# Altium footprint library cool_library.PcbLib: 1182 footprints (part 32 of 75)
Each footprint in its own frame and in the unit in brackets; x right, y up, seen from the top. Pads: shape width x height; smd on the part's side, far side on the other; paste and mask are expansions set on the pad; w line width, h text height; cw(c..) or ccw(c..) is an arc to the next point about the centre after c.
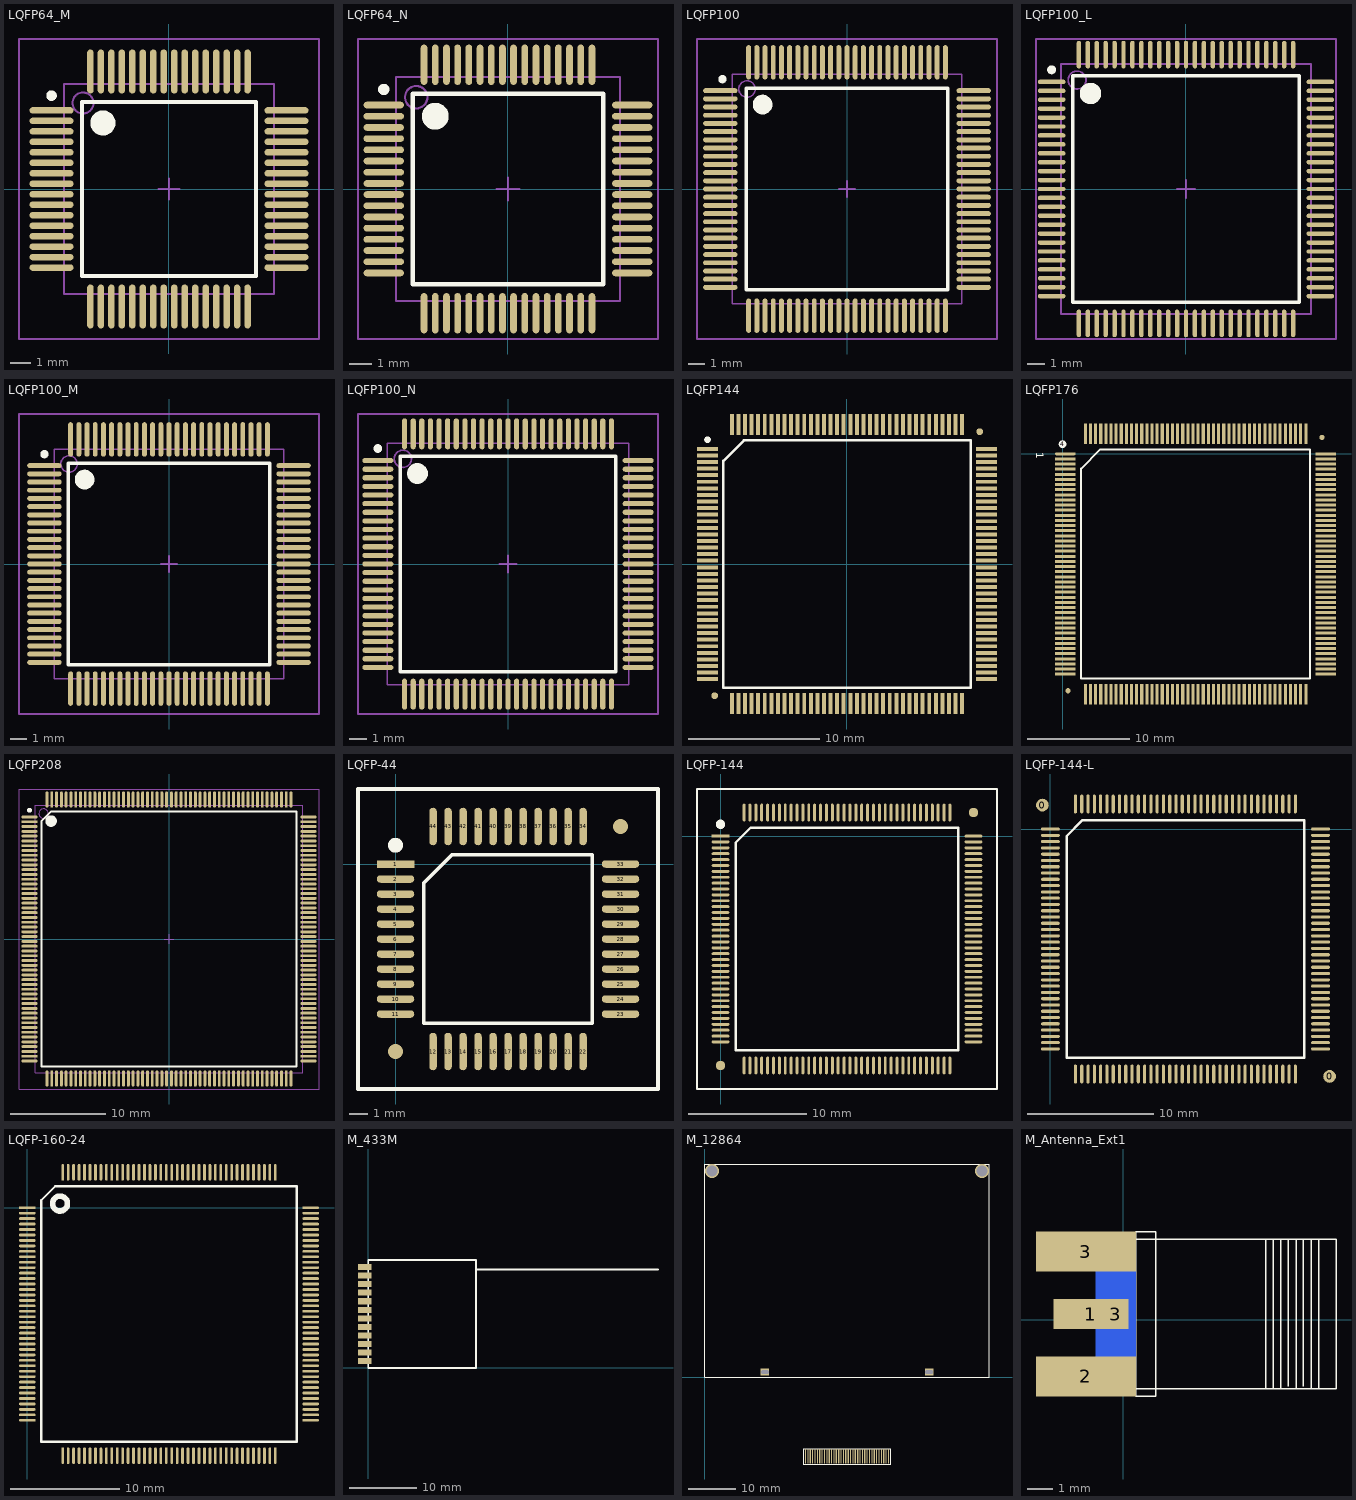
[diagram p31: the footprints below, top view; thin cyan lines are the x and y axes]

## LQFP64_M [mm] "Thin QFP, 64-Leads, Body 10x10mm, Pitch 0.5mm, IPC Low Density"
height 1.6
pads (64):
  oval 2.1x0.3 smd: 1(-5.6,3.75) 2(-5.6,3.25) 3(-5.6,2.75) 4(-5.6,2.25) 5(-5.6,1.75) 6(-5.6,1.25) 7(-5.6,0.75) 8(-5.6,0.25) 9(-5.6,-0.25) 10(-5.6,-0.75) 11(-5.6,-1.25) 12(-5.6,-1.75) 13(-5.6,-2.25) 14(-5.6,-2.75) 15(-5.6,-3.25) 16(-5.6,-3.75) 33(5.6,-3.75) 34(5.6,-3.25) 35(5.6,-2.75) 36(5.6,-2.25) 37(5.6,-1.75) 38(5.6,-1.25) 39(5.6,-0.75) 40(5.6,-0.25) 41(5.6,0.25) 42(5.6,0.75) 43(5.6,1.25) 44(5.6,1.75) 45(5.6,2.25) 46(5.6,2.75) 47(5.6,3.25) 48(5.6,3.75)
  oval 0.3x2.1 smd: 17(-3.75,-5.6) 18(-3.25,-5.6) 19(-2.75,-5.6) 20(-2.25,-5.6) 21(-1.75,-5.6) 22(-1.25,-5.6) 23(-0.75,-5.6) 24(-0.25,-5.6) 25(0.25,-5.6) 26(0.75,-5.6) 27(1.25,-5.6) 28(1.75,-5.6) 29(2.25,-5.6) 30(2.75,-5.6) 31(3.25,-5.6) 32(3.75,-5.6) 49(3.75,5.6) 50(3.25,5.6) 51(2.75,5.6) 52(2.25,5.6) 53(1.75,5.6) 54(1.25,5.6) 55(0.75,5.6) 56(0.25,5.6) 57(-0.25,5.6) 58(-0.75,5.6) 59(-1.25,5.6) 60(-1.75,5.6) 61(-2.25,5.6) 62(-2.75,5.6) 63(-3.25,5.6) 64(-3.75,5.6)
Top Overlay:
  circle w0.6: c-3.15,3.15 r0.3
  circle w0.25: c-5.6,4.45 r0.125
  lines w0.2: -4.15,-4.15 4.15,-4.15 4.15,4.15 -4.15,4.15 -4.15,-4.15
Mechanical 13:
  circle w0.1: c-4.1,4.1 r0.5
  lines w0.1: -5,-5 5,-5 5,5 -5,5 -5,-5
Mechanical 15:
  lines w0.1: -0.5,0 0.5,0 ; 0,-0.5 0,0.5 ; -7.15,-7.15 7.15,-7.15 7.15,7.15 -7.15,7.15 -7.15,-7.15
3D body: height 1.6, standoff 0, extent -5,-5 5,5

## LQFP64_N [mm] "Thin QFP, 64-Leads, Body 10x10mm, Pitch 0.5mm, IPC Medium Density"
height 1.6
pads (64):
  oval 1.8x0.3 smd: 1(-5.55,3.75) 2(-5.55,3.25) 3(-5.55,2.75) 4(-5.55,2.25) 5(-5.55,1.75) 6(-5.55,1.25) 7(-5.55,0.75) 8(-5.55,0.25) 9(-5.55,-0.25) 10(-5.55,-0.75) 11(-5.55,-1.25) 12(-5.55,-1.75) 13(-5.55,-2.25) 14(-5.55,-2.75) 15(-5.55,-3.25) 16(-5.55,-3.75) 33(5.55,-3.75) 34(5.55,-3.25) 35(5.55,-2.75) 36(5.55,-2.25) 37(5.55,-1.75) 38(5.55,-1.25) 39(5.55,-0.75) 40(5.55,-0.25) 41(5.55,0.25) 42(5.55,0.75) 43(5.55,1.25) 44(5.55,1.75) 45(5.55,2.25) 46(5.55,2.75) 47(5.55,3.25) 48(5.55,3.75)
  oval 0.3x1.8 smd: 17(-3.75,-5.55) 18(-3.25,-5.55) 19(-2.75,-5.55) 20(-2.25,-5.55) 21(-1.75,-5.55) 22(-1.25,-5.55) 23(-0.75,-5.55) 24(-0.25,-5.55) 25(0.25,-5.55) 26(0.75,-5.55) 27(1.25,-5.55) 28(1.75,-5.55) 29(2.25,-5.55) 30(2.75,-5.55) 31(3.25,-5.55) 32(3.75,-5.55) 49(3.75,5.55) 50(3.25,5.55) 51(2.75,5.55) 52(2.25,5.55) 53(1.75,5.55) 54(1.25,5.55) 55(0.75,5.55) 56(0.25,5.55) 57(-0.25,5.55) 58(-0.75,5.55) 59(-1.25,5.55) 60(-1.75,5.55) 61(-2.25,5.55) 62(-2.75,5.55) 63(-3.25,5.55) 64(-3.75,5.55)
Top Overlay:
  circle w0.6: c-3.25,3.25 r0.3
  circle w0.25: c-5.55,4.45 r0.125
  lines w0.2: -4.25,-4.25 4.25,-4.25 4.25,4.25 -4.25,4.25 -4.25,-4.25
Mechanical 13:
  circle w0.1: c-4.1,4.1 r0.5
  lines w0.1: -5,-5 5,-5 5,5 -5,5 -5,-5
Mechanical 15:
  lines w0.1: -0.5,0 0.5,0 ; 0,-0.5 0,0.5 ; -6.7,-6.7 6.7,-6.7 6.7,6.7 -6.7,6.7 -6.7,-6.7
3D body: height 1.6, standoff 0, extent -5,-5 5,5

## LQFP100 [mm]
pads (100):
  oval 2.1x0.3 smd: 1(-7.727,6) 2(-7.727,5.5) 3(-7.727,5) 4(-7.727,4.5) 5(-7.727,4) 6(-7.727,3.5) 7(-7.727,3) 8(-7.727,2.5) 9(-7.727,2) 10(-7.727,1.5) 11(-7.727,1) 12(-7.727,0.5) 13(-7.727,0) 14(-7.727,-0.5) 15(-7.727,-1) 16(-7.727,-1.5) 17(-7.727,-2) 18(-7.727,-2.5) 19(-7.727,-3) 20(-7.727,-3.5) 21(-7.727,-4) 22(-7.727,-4.5) 23(-7.727,-5) 24(-7.727,-5.5) 25(-7.727,-6) 51(7.727,-6) 52(7.727,-5.5) 53(7.727,-5) 54(7.727,-4.5) 55(7.727,-4) 56(7.727,-3.5) 57(7.727,-3) 58(7.727,-2.5) 59(7.727,-2) 60(7.727,-1.5) 61(7.727,-1) 62(7.727,-0.5) 63(7.727,0) 64(7.727,0.5) 65(7.727,1) 66(7.727,1.5) 67(7.727,2) 68(7.727,2.5) 69(7.727,3) 70(7.727,3.5) 71(7.727,4) 72(7.727,4.5) 73(7.727,5) 74(7.727,5.5) 75(7.727,6)
  oval 0.3x2.1 smd: 26(-6,-7.727) 27(-5.5,-7.727) 28(-5,-7.727) 29(-4.5,-7.727) 30(-4,-7.727) 31(-3.5,-7.727) 32(-3,-7.727) 33(-2.5,-7.727) 34(-2,-7.727) 35(-1.5,-7.727) 36(-1,-7.727) 37(-0.5,-7.727) 38(0,-7.727) 39(0.5,-7.727) 40(1,-7.727) 41(1.5,-7.727) 42(2,-7.727) 43(2.5,-7.727) 44(3,-7.727) 45(3.5,-7.727) 46(4,-7.727) 47(4.5,-7.727) 48(5,-7.727) 49(5.5,-7.727) 50(6,-7.727) 76(6,7.727) 77(5.5,7.727) 78(5,7.727) 79(4.5,7.727) 80(4,7.727) 81(3.5,7.727) 82(3,7.727) 83(2.5,7.727) 84(2,7.727) 85(1.5,7.727) 86(1,7.727) 87(0.5,7.727) 88(0,7.727) 89(-0.5,7.727) 90(-1,7.727) 91(-1.5,7.727) 92(-2,7.727) 93(-2.5,7.727) 94(-3,7.727) 95(-3.5,7.727) 96(-4,7.727) 97(-4.5,7.727) 98(-5,7.727) 99(-5.5,7.727) 100(-6,7.727)
Top Overlay:
  circle w0.6: c-5.15,5.15 r0.3
  circle w0.25: c-7.6,6.7 r0.125
  lines w0.2: -6.15,-6.15 6.15,-6.15 6.15,6.15 -6.15,6.15 -6.15,-6.15
Mechanical 13:
  circle w0.1: c-6.1,6.1 r0.5
  lines w0.1: -7,-7 7,-7 7,7 -7,7 -7,-7
Mechanical 15:
  lines w0.1: -0.5,0 0.5,0 ; 0,-0.5 0,0.5 ; -9.15,-9.15 9.15,-9.15 9.15,9.15 -9.15,9.15 -9.15,-9.15
3D body: height 1.6, standoff 0, extent -7.999,-8 8.001,8

## LQFP100_L [mm] "Thin QFP, 100-Leads, Body 14x14mm, Pitch 0.5mm, IPC High Density"
height 1.6
pads (100):
  oval 1.55x0.25 smd: 1(-7.525,6) 2(-7.525,5.5) 3(-7.525,5) 4(-7.525,4.5) 5(-7.525,4) 6(-7.525,3.5) 7(-7.525,3) 8(-7.525,2.5) 9(-7.525,2) 10(-7.525,1.5) 11(-7.525,1) 12(-7.525,0.5) 13(-7.525,0) 14(-7.525,-0.5) 15(-7.525,-1) 16(-7.525,-1.5) 17(-7.525,-2) 18(-7.525,-2.5) 19(-7.525,-3) 20(-7.525,-3.5) 21(-7.525,-4) 22(-7.525,-4.5) 23(-7.525,-5) 24(-7.525,-5.5) 25(-7.525,-6) 51(7.525,-6) 52(7.525,-5.5) 53(7.525,-5) 54(7.525,-4.5) 55(7.525,-4) 56(7.525,-3.5) 57(7.525,-3) 58(7.525,-2.5) 59(7.525,-2) 60(7.525,-1.5) 61(7.525,-1) 62(7.525,-0.5) 63(7.525,0) 64(7.525,0.5) 65(7.525,1) 66(7.525,1.5) 67(7.525,2) 68(7.525,2.5) 69(7.525,3) 70(7.525,3.5) 71(7.525,4) 72(7.525,4.5) 73(7.525,5) 74(7.525,5.5) 75(7.525,6)
  oval 0.25x1.55 smd: 26(-6,-7.525) 27(-5.5,-7.525) 28(-5,-7.525) 29(-4.5,-7.525) 30(-4,-7.525) 31(-3.5,-7.525) 32(-3,-7.525) 33(-2.5,-7.525) 34(-2,-7.525) 35(-1.5,-7.525) 36(-1,-7.525) 37(-0.5,-7.525) 38(0,-7.525) 39(0.5,-7.525) 40(1,-7.525) 41(1.5,-7.525) 42(2,-7.525) 43(2.5,-7.525) 44(3,-7.525) 45(3.5,-7.525) 46(4,-7.525) 47(4.5,-7.525) 48(5,-7.525) 49(5.5,-7.525) 50(6,-7.525) 76(6,7.525) 77(5.5,7.525) 78(5,7.525) 79(4.5,7.525) 80(4,7.525) 81(3.5,7.525) 82(3,7.525) 83(2.5,7.525) 84(2,7.525) 85(1.5,7.525) 86(1,7.525) 87(0.5,7.525) 88(0,7.525) 89(-0.5,7.525) 90(-1,7.525) 91(-1.5,7.525) 92(-2,7.525) 93(-2.5,7.525) 94(-3,7.525) 95(-3.5,7.525) 96(-4,7.525) 97(-4.5,7.525) 98(-5,7.525) 99(-5.5,7.525) 100(-6,7.525)
Top Overlay:
  circle w0.6: c-5.35,5.35 r0.3
  circle w0.25: c-7.525,6.675 r0.125
  lines w0.2: -6.35,-6.35 6.35,-6.35 6.35,6.35 -6.35,6.35 -6.35,-6.35
Mechanical 13:
  circle w0.1: c-6.1,6.1 r0.5
  lines w0.1: -7,-7 7,-7 7,7 -7,7 -7,-7
Mechanical 15:
  lines w0.1: -0.5,0 0.5,0 ; 0,-0.5 0,0.5 ; -8.4,-8.4 8.4,-8.4 8.4,8.4 -8.4,8.4 -8.4,-8.4
3D body: height 1.6, standoff 0, extent -7,-7 7,7

## LQFP100_M [mm] "Thin QFP, 100-Leads, Body 14x14mm, Pitch 0.5mm, IPC Low Density"
height 1.6
pads (100):
  oval 2.1x0.3 smd: 1(-7.6,6) 2(-7.6,5.5) 3(-7.6,5) 4(-7.6,4.5) 5(-7.6,4) 6(-7.6,3.5) 7(-7.6,3) 8(-7.6,2.5) 9(-7.6,2) 10(-7.6,1.5) 11(-7.6,1) 12(-7.6,0.5) 13(-7.6,0) 14(-7.6,-0.5) 15(-7.6,-1) 16(-7.6,-1.5) 17(-7.6,-2) 18(-7.6,-2.5) 19(-7.6,-3) 20(-7.6,-3.5) 21(-7.6,-4) 22(-7.6,-4.5) 23(-7.6,-5) 24(-7.6,-5.5) 25(-7.6,-6) 51(7.6,-6) 52(7.6,-5.5) 53(7.6,-5) 54(7.6,-4.5) 55(7.6,-4) 56(7.6,-3.5) 57(7.6,-3) 58(7.6,-2.5) 59(7.6,-2) 60(7.6,-1.5) 61(7.6,-1) 62(7.6,-0.5) 63(7.6,0) 64(7.6,0.5) 65(7.6,1) 66(7.6,1.5) 67(7.6,2) 68(7.6,2.5) 69(7.6,3) 70(7.6,3.5) 71(7.6,4) 72(7.6,4.5) 73(7.6,5) 74(7.6,5.5) 75(7.6,6)
  oval 0.3x2.1 smd: 26(-6,-7.6) 27(-5.5,-7.6) 28(-5,-7.6) 29(-4.5,-7.6) 30(-4,-7.6) 31(-3.5,-7.6) 32(-3,-7.6) 33(-2.5,-7.6) 34(-2,-7.6) 35(-1.5,-7.6) 36(-1,-7.6) 37(-0.5,-7.6) 38(0,-7.6) 39(0.5,-7.6) 40(1,-7.6) 41(1.5,-7.6) 42(2,-7.6) 43(2.5,-7.6) 44(3,-7.6) 45(3.5,-7.6) 46(4,-7.6) 47(4.5,-7.6) 48(5,-7.6) 49(5.5,-7.6) 50(6,-7.6) 76(6,7.6) 77(5.5,7.6) 78(5,7.6) 79(4.5,7.6) 80(4,7.6) 81(3.5,7.6) 82(3,7.6) 83(2.5,7.6) 84(2,7.6) 85(1.5,7.6) 86(1,7.6) 87(0.5,7.6) 88(0,7.6) 89(-0.5,7.6) 90(-1,7.6) 91(-1.5,7.6) 92(-2,7.6) 93(-2.5,7.6) 94(-3,7.6) 95(-3.5,7.6) 96(-4,7.6) 97(-4.5,7.6) 98(-5,7.6) 99(-5.5,7.6) 100(-6,7.6)
Top Overlay:
  circle w0.6: c-5.15,5.15 r0.3
  circle w0.25: c-7.6,6.7 r0.125
  lines w0.2: -6.15,-6.15 6.15,-6.15 6.15,6.15 -6.15,6.15 -6.15,-6.15
Mechanical 13:
  circle w0.1: c-6.1,6.1 r0.5
  lines w0.1: -7,-7 7,-7 7,7 -7,7 -7,-7
Mechanical 15:
  lines w0.1: -0.5,0 0.5,0 ; 0,-0.5 0,0.5 ; -9.15,-9.15 9.15,-9.15 9.15,9.15 -9.15,9.15 -9.15,-9.15
3D body: height 1.6, standoff 0, extent -7,-7 7,7

## LQFP100_N [mm] "Thin QFP, 100-Leads, Body 14x14mm, Pitch 0.5mm, IPC Medium Density"
height 1.6
pads (100):
  oval 1.8x0.3 smd: 1(-7.55,6) 2(-7.55,5.5) 3(-7.55,5) 4(-7.55,4.5) 5(-7.55,4) 6(-7.55,3.5) 7(-7.55,3) 8(-7.55,2.5) 9(-7.55,2) 10(-7.55,1.5) 11(-7.55,1) 12(-7.55,0.5) 13(-7.55,0) 14(-7.55,-0.5) 15(-7.55,-1) 16(-7.55,-1.5) 17(-7.55,-2) 18(-7.55,-2.5) 19(-7.55,-3) 20(-7.55,-3.5) 21(-7.55,-4) 22(-7.55,-4.5) 23(-7.55,-5) 24(-7.55,-5.5) 25(-7.55,-6) 51(7.55,-6) 52(7.55,-5.5) 53(7.55,-5) 54(7.55,-4.5) 55(7.55,-4) 56(7.55,-3.5) 57(7.55,-3) 58(7.55,-2.5) 59(7.55,-2) 60(7.55,-1.5) 61(7.55,-1) 62(7.55,-0.5) 63(7.55,0) 64(7.55,0.5) 65(7.55,1) 66(7.55,1.5) 67(7.55,2) 68(7.55,2.5) 69(7.55,3) 70(7.55,3.5) 71(7.55,4) 72(7.55,4.5) 73(7.55,5) 74(7.55,5.5) 75(7.55,6)
  oval 0.3x1.8 smd: 26(-6,-7.55) 27(-5.5,-7.55) 28(-5,-7.55) 29(-4.5,-7.55) 30(-4,-7.55) 31(-3.5,-7.55) 32(-3,-7.55) 33(-2.5,-7.55) 34(-2,-7.55) 35(-1.5,-7.55) 36(-1,-7.55) 37(-0.5,-7.55) 38(0,-7.55) 39(0.5,-7.55) 40(1,-7.55) 41(1.5,-7.55) 42(2,-7.55) 43(2.5,-7.55) 44(3,-7.55) 45(3.5,-7.55) 46(4,-7.55) 47(4.5,-7.55) 48(5,-7.55) 49(5.5,-7.55) 50(6,-7.55) 76(6,7.55) 77(5.5,7.55) 78(5,7.55) 79(4.5,7.55) 80(4,7.55) 81(3.5,7.55) 82(3,7.55) 83(2.5,7.55) 84(2,7.55) 85(1.5,7.55) 86(1,7.55) 87(0.5,7.55) 88(0,7.55) 89(-0.5,7.55) 90(-1,7.55) 91(-1.5,7.55) 92(-2,7.55) 93(-2.5,7.55) 94(-3,7.55) 95(-3.5,7.55) 96(-4,7.55) 97(-4.5,7.55) 98(-5,7.55) 99(-5.5,7.55) 100(-6,7.55)
Top Overlay:
  circle w0.25: c-7.55,6.7 r0.125
  circle w0.6: c-5.25,5.25 r0.3
  lines w0.2: -6.25,-6.25 -6.25,6.25 6.25,6.25 6.25,-6.25 -6.25,-6.25
Mechanical 13:
  circle w0.1: c-6.1,6.1 r0.5
  lines w0.1: -7,-7 -7,7 7,7 7,-7 -7,-7
Mechanical 15:
  lines w0.1: -0.5,0 0.5,0 ; 0,-0.5 0,0.5 ; -8.7,-8.7 -8.7,8.7 8.7,8.7 8.7,-8.7 -8.7,-8.7
3D body: height 1.6, standoff 0, extent -7,-7 7,7

## LQFP144 [mm]
pads (146):
  rect 1.6x0.3 smd: 1(-10.6,8.75) 2(-10.6,8.25) 3(-10.6,7.75) 4(-10.6,7.25) 5(-10.6,6.75) 6(-10.6,6.25) 7(-10.6,5.75) 8(-10.6,5.25) 9(-10.6,4.75) 10(-10.6,4.25) 11(-10.6,3.75) 12(-10.6,3.25) 13(-10.6,2.75) 14(-10.6,2.25) 15(-10.6,1.75) 16(-10.6,1.25) 17(-10.6,0.75) 18(-10.6,0.25) 19(-10.6,-0.25) 20(-10.6,-0.75) 21(-10.6,-1.25) 22(-10.6,-1.75) 23(-10.6,-2.25) 24(-10.6,-2.75) 25(-10.6,-3.25) 26(-10.6,-3.75) 27(-10.6,-4.25) 28(-10.6,-4.75) 29(-10.6,-5.25) 30(-10.6,-5.75) 31(-10.6,-6.25) 32(-10.6,-6.75) 33(-10.6,-7.25) 34(-10.6,-7.75) 35(-10.6,-8.25) 36(-10.6,-8.75) 73(10.6,-8.75) 74(10.6,-8.25) 75(10.6,-7.75) 76(10.6,-7.25) 77(10.6,-6.75) 78(10.6,-6.25) 79(10.6,-5.75) 80(10.6,-5.25) 81(10.6,-4.75) 82(10.6,-4.25) 83(10.6,-3.75) 84(10.6,-3.25) 85(10.6,-2.75) 86(10.6,-2.25) 87(10.6,-1.75) 88(10.6,-1.25) 89(10.6,-0.75) 90(10.6,-0.25) 91(10.6,0.25) 92(10.6,0.75) 93(10.6,1.25) 94(10.6,1.75) 95(10.6,2.25) 96(10.6,2.75) 97(10.6,3.25) 98(10.6,3.75) 99(10.6,4.25) 100(10.6,4.75) 101(10.6,5.25) 102(10.6,5.75) 103(10.6,6.25) 104(10.6,6.75) 105(10.6,7.25) 106(10.6,7.75) 107(10.6,8.25) 108(10.6,8.75)
  round 0.508 smd: 6(10.084,10.058) 7(-10.058,-10.008)
  rect 0.3x1.6 smd: 37(-8.75,-10.6) 38(-8.25,-10.6) 39(-7.75,-10.6) 40(-7.25,-10.6) 41(-6.75,-10.6) 42(-6.25,-10.6) 43(-5.75,-10.6) 44(-5.25,-10.6) 45(-4.75,-10.6) 46(-4.25,-10.6) 47(-3.75,-10.6) 48(-3.25,-10.6) 49(-2.75,-10.6) 50(-2.25,-10.6) 51(-1.75,-10.6) 52(-1.25,-10.6) 53(-0.75,-10.6) 54(-0.25,-10.6) 55(0.25,-10.6) 56(0.75,-10.6) 57(1.25,-10.6) 58(1.75,-10.6) 59(2.25,-10.6) 60(2.75,-10.6) 61(3.25,-10.6) 62(3.75,-10.6) 63(4.25,-10.6) 64(4.75,-10.6) 65(5.25,-10.6) 66(5.75,-10.6) 67(6.25,-10.6) 68(6.75,-10.6) 69(7.25,-10.6) 70(7.75,-10.6) 71(8.25,-10.6) 72(8.75,-10.6) 109(8.75,10.6) 110(8.25,10.6) 111(7.75,10.6) 112(7.25,10.6) 113(6.75,10.6) 114(6.25,10.6) 115(5.75,10.6) 116(5.25,10.6) 117(4.75,10.6) 118(4.25,10.6) 119(3.75,10.6) 120(3.25,10.6) 121(2.75,10.6) 122(2.25,10.6) 123(1.75,10.6) 124(1.25,10.6) 125(0.75,10.6) 126(0.25,10.6) 127(-0.25,10.6) 128(-0.75,10.6) 129(-1.25,10.6) 130(-1.75,10.6) 131(-2.25,10.6) 132(-2.75,10.6) 133(-3.25,10.6) 134(-3.75,10.6) 135(-4.25,10.6) 136(-4.75,10.6) 137(-5.25,10.6) 138(-5.75,10.6) 139(-6.25,10.6) 140(-6.75,10.6) 141(-7.25,10.6) 142(-7.75,10.6) 143(-8.25,10.6) 144(-8.75,10.6)
Top Overlay:
  circle w0.25: c-10.6,9.45 r0.125
  lines w0.2: -9.4,-9.4 -9.4,7.847 -7.847,9.4 9.4,9.4 9.4,-9.4 -9.4,-9.4
3D body: height 1.1, standoff 0, extent -10.983,-11.009 11.034,11.009

## LQFP176 [mm]
pads (179):
  oval 2x0.3 smd: 1(0.254,0)
  rect 2x0.3 smd: 2(0.254,-0.5) 3(0.254,-1) 4(0.254,-1.5) 5(0.254,-2) 6(0.254,-2.5) 7(0.254,-3) 8(0.254,-3.5) 9(0.254,-4) 10(0.254,-4.5) 11(0.254,-5) 12(0.254,-5.5) 13(0.254,-6) 14(0.254,-6.5) 15(0.254,-7) 16(0.254,-7.5) 17(0.254,-8) 18(0.254,-8.5) 19(0.254,-9) 20(0.254,-9.5) 21(0.254,-10) 22(0.254,-10.5) 23(0.254,-11) 24(0.254,-11.5) 25(0.254,-12) 26(0.254,-12.5) 27(0.254,-13) 28(0.254,-13.5) 29(0.254,-14) 30(0.254,-14.5) 31(0.254,-15) 32(0.254,-15.5) 33(0.254,-16) 34(0.254,-16.5) 35(0.254,-17) 36(0.254,-17.5) 37(0.254,-18) 38(0.254,-18.5) 39(0.254,-19) 40(0.254,-19.5) 41(0.254,-20) 42(0.254,-20.5) 43(0.254,-21) 44(0.254,-21.5) 89(25.646,-21.5) 90(25.646,-21) 91(25.646,-20.5) 92(25.646,-20) 93(25.646,-19.5) 94(25.646,-19) 95(25.646,-18.5) 96(25.646,-18) 97(25.646,-17.5) 98(25.646,-17) 99(25.646,-16.5) 100(25.646,-16) 101(25.646,-15.5) 102(25.646,-15) 103(25.646,-14.5) 104(25.646,-14) 105(25.646,-13.5) 106(25.646,-13) 107(25.646,-12.5) 108(25.646,-12) 109(25.646,-11.5) 110(25.646,-11) 111(25.646,-10.5) 112(25.646,-10) 113(25.646,-9.5) 114(25.646,-9) 115(25.646,-8.5) 116(25.646,-8) 117(25.646,-7.5) 118(25.646,-7) 119(25.646,-6.5) 120(25.646,-6) 121(25.646,-5.5) 122(25.646,-5) 123(25.646,-4.5) 124(25.646,-4) 125(25.646,-3.5) 126(25.646,-3) 127(25.646,-2.5) 128(25.646,-2) 129(25.646,-1.5) 130(25.646,-1) 131(25.646,-0.5) 132(25.646,0)
  round 0.508 smd: 2(25.273,1.6) 3(0.508,-23.114)
  round 0.762 on Top Overlay: 4(-0.025,0.94)
  rect 0.3x2 smd: 45(2.2,-23.446) 46(2.7,-23.446) 47(3.2,-23.446) 48(3.7,-23.446) 49(4.2,-23.446) 50(4.7,-23.446) 51(5.2,-23.446) 52(5.7,-23.446) 53(6.2,-23.446) 54(6.7,-23.446) 55(7.2,-23.446) 56(7.7,-23.446) 57(8.2,-23.446) 58(8.7,-23.446) 59(9.2,-23.446) 60(9.7,-23.446) 61(10.2,-23.446) 62(10.7,-23.446) 63(11.2,-23.446) 64(11.7,-23.446) 65(12.2,-23.446) 66(12.7,-23.446) 67(13.2,-23.446) 68(13.7,-23.446) 69(14.2,-23.446) 70(14.7,-23.446) 71(15.2,-23.446) 72(15.7,-23.446) 73(16.2,-23.446) 74(16.7,-23.446) 75(17.2,-23.446) 76(17.7,-23.446) 77(18.2,-23.446) 78(18.7,-23.446) 79(19.2,-23.446) 80(19.7,-23.446) 81(20.2,-23.446) 82(20.7,-23.446) 83(21.2,-23.446) 84(21.7,-23.446) 85(22.2,-23.446) 86(22.7,-23.446) 87(23.2,-23.446) 88(23.7,-23.446) 133(23.7,1.946) 134(23.2,1.946) 135(22.7,1.946) 136(22.2,1.946) 137(21.7,1.946) 138(21.2,1.946) 139(20.7,1.946) 140(20.2,1.946) 141(19.7,1.946) 142(19.2,1.946) 143(18.7,1.946) 144(18.2,1.946) 145(17.7,1.946) 146(17.2,1.946) 147(16.7,1.946) 148(16.2,1.946) 149(15.7,1.946) 150(15.2,1.946) 151(14.7,1.946) 152(14.2,1.946) 153(13.7,1.946) 154(13.2,1.946) 155(12.7,1.946) 156(12.2,1.946) 157(11.7,1.946) 158(11.2,1.946) 159(10.7,1.946) 160(10.2,1.946) 161(9.7,1.946) 162(9.2,1.946) 163(8.7,1.946) 164(8.2,1.946) 165(7.7,1.946) 166(7.2,1.946) 167(6.7,1.946) 168(6.2,1.946) 169(5.7,1.946) 170(5.2,1.946) 171(4.7,1.946) 172(4.2,1.946) 173(3.7,1.946) 174(3.2,1.946) 175(2.7,1.946) 176(2.2,1.946)
Top Overlay:
  lines w0.2: 24.079,0.432 3.658,0.432 1.785,-1.441 1.785,-21.915 24.115,-21.915 24.115,0.415
  text "1" at -2.616,0.127 h0.76
3D body: height 1.1, standoff 0, extent -0.055,-23.753 25.963,2.265

## LQFP208 [mm] "TSQFP, 208-Leads, Body 28.00x28.00mm, Pitch 0.50mm, IPC Medium Density"
height 1.6
pads (208):
  oval 1.7x0.3 smd: 1(-14.575,12.75) 2(-14.575,12.25) 3(-14.575,11.75) 4(-14.575,11.25) 5(-14.575,10.75) 6(-14.575,10.25) 7(-14.575,9.75) 8(-14.575,9.25) 9(-14.575,8.75) 10(-14.575,8.25) 11(-14.575,7.75) 12(-14.575,7.25) 13(-14.575,6.75) 14(-14.575,6.25) 15(-14.575,5.75) 16(-14.575,5.25) 17(-14.575,4.75) 18(-14.575,4.25) 19(-14.575,3.75) 20(-14.575,3.25) 21(-14.575,2.75) 22(-14.575,2.25) 23(-14.575,1.75) 24(-14.575,1.25) 25(-14.575,0.75) 26(-14.575,0.25) 27(-14.575,-0.25) 28(-14.575,-0.75) 29(-14.575,-1.25) 30(-14.575,-1.75) 31(-14.575,-2.25) 32(-14.575,-2.75) 33(-14.575,-3.25) 34(-14.575,-3.75) 35(-14.575,-4.25) 36(-14.575,-4.75) 37(-14.575,-5.25) 38(-14.575,-5.75) 39(-14.575,-6.25) 40(-14.575,-6.75) 41(-14.575,-7.25) 42(-14.575,-7.75) 43(-14.575,-8.25) 44(-14.575,-8.75) 45(-14.575,-9.25) 46(-14.575,-9.75) 47(-14.575,-10.25) 48(-14.575,-10.75) 49(-14.575,-11.25) 50(-14.575,-11.75) 51(-14.575,-12.25) 52(-14.575,-12.75) 105(14.575,-12.75) 106(14.575,-12.25) 107(14.575,-11.75) 108(14.575,-11.25) 109(14.575,-10.75) 110(14.575,-10.25) 111(14.575,-9.75) 112(14.575,-9.25) 113(14.575,-8.75) 114(14.575,-8.25) 115(14.575,-7.75) 116(14.575,-7.25) 117(14.575,-6.75) 118(14.575,-6.25) 119(14.575,-5.75) 120(14.575,-5.25) 121(14.575,-4.75) 122(14.575,-4.25) 123(14.575,-3.75) 124(14.575,-3.25) 125(14.575,-2.75) 126(14.575,-2.25) 127(14.575,-1.75) 128(14.575,-1.25) 129(14.575,-0.75) 130(14.575,-0.25) 131(14.575,0.25) 132(14.575,0.75) 133(14.575,1.25) 134(14.575,1.75) 135(14.575,2.25) 136(14.575,2.75) 137(14.575,3.25) 138(14.575,3.75) 139(14.575,4.25) 140(14.575,4.75) 141(14.575,5.25) 142(14.575,5.75) 143(14.575,6.25) 144(14.575,6.75) 145(14.575,7.25) 146(14.575,7.75) 147(14.575,8.25) 148(14.575,8.75) 149(14.575,9.25) 150(14.575,9.75) 151(14.575,10.25) 152(14.575,10.75) 153(14.575,11.25) 154(14.575,11.75) 155(14.575,12.25) 156(14.575,12.75)
  oval 0.3x1.7 smd: 53(-12.75,-14.575) 54(-12.25,-14.575) 55(-11.75,-14.575) 56(-11.25,-14.575) 57(-10.75,-14.575) 58(-10.25,-14.575) 59(-9.75,-14.575) 60(-9.25,-14.575) 61(-8.75,-14.575) 62(-8.25,-14.575) 63(-7.75,-14.575) 64(-7.25,-14.575) 65(-6.75,-14.575) 66(-6.25,-14.575) 67(-5.75,-14.575) 68(-5.25,-14.575) 69(-4.75,-14.575) 70(-4.25,-14.575) 71(-3.75,-14.575) 72(-3.25,-14.575) 73(-2.75,-14.575) 74(-2.25,-14.575) 75(-1.75,-14.575) 76(-1.25,-14.575) 77(-0.75,-14.575) 78(-0.25,-14.575) 79(0.25,-14.575) 80(0.75,-14.575) 81(1.25,-14.575) 82(1.75,-14.575) 83(2.25,-14.575) 84(2.75,-14.575) 85(3.25,-14.575) 86(3.75,-14.575) 87(4.25,-14.575) 88(4.75,-14.575) 89(5.25,-14.575) 90(5.75,-14.575) 91(6.25,-14.575) 92(6.75,-14.575) 93(7.25,-14.575) 94(7.75,-14.575) 95(8.25,-14.575) 96(8.75,-14.575) 97(9.25,-14.575) 98(9.75,-14.575) 99(10.25,-14.575) 100(10.75,-14.575) 101(11.25,-14.575) 102(11.75,-14.575) 103(12.25,-14.575) 104(12.75,-14.575) 157(12.75,14.575) 158(12.25,14.575) 159(11.75,14.575) 160(11.25,14.575) 161(10.75,14.575) 162(10.25,14.575) 163(9.75,14.575) 164(9.25,14.575) 165(8.75,14.575) 166(8.25,14.575) 167(7.75,14.575) 168(7.25,14.575) 169(6.75,14.575) 170(6.25,14.575) 171(5.75,14.575) 172(5.25,14.575) 173(4.75,14.575) 174(4.25,14.575) 175(3.75,14.575) 176(3.25,14.575) 177(2.75,14.575) 178(2.25,14.575) 179(1.75,14.575) 180(1.25,14.575) 181(0.75,14.575) 182(0.25,14.575) 183(-0.25,14.575) 184(-0.75,14.575) 185(-1.25,14.575) 186(-1.75,14.575) 187(-2.25,14.575) 188(-2.75,14.575) 189(-3.25,14.575) 190(-3.75,14.575) 191(-4.25,14.575) 192(-4.75,14.575) 193(-5.25,14.575) 194(-5.75,14.575) 195(-6.25,14.575) 196(-6.75,14.575) 197(-7.25,14.575) 198(-7.75,14.575) 199(-8.25,14.575) 200(-8.75,14.575) 201(-9.25,14.575) 202(-9.75,14.575) 203(-10.25,14.575) 204(-10.75,14.575) 205(-11.25,14.575) 206(-11.75,14.575) 207(-12.25,14.575) 208(-12.75,14.575)
Top Overlay:
  circle w0.25: c-14.575,13.45 r0.125
  circle w0.6: c-12.325,12.325 r0.3
  lines w0.2: -13.325,-13.325 13.325,-13.325 13.325,13.325 -12.329,13.325 -13.325,12.329 -13.325,-13.325
Mechanical 13:
  circle w0.1: c-13.1,13.1 r0.5
  lines w0.1: -14,-14 -14,14 14,14 14,-14 -14,-14
Mechanical 15:
  lines w0.05: -15.675,-15.675 -15.675,15.675 15.675,15.675 15.675,-15.675 -15.675,-15.675
  lines w0.1: -0.5,0 0.5,0 ; 0,-0.5 0,0.5
3D body: height 4.15, standoff -0.08, extent -15.309,-15.249 15.291,15.351

## LQFP-44 [mm]
pads (46):
  rect 2x0.4 smd: 1(0,0)
  oval 2x0.4 smd: 2(0,-0.8) 3(0,-1.6) 4(0,-2.4) 5(0,-3.2) 6(0,-4) 7(0,-4.8) 8(0,-5.6) 9(0,-6.4) 10(0,-7.2) 11(0,-8) 23(12,-8) 24(12,-7.2) 25(12,-6.4) 26(12,-5.6) 27(12,-4.8) 28(12,-4) 29(12,-3.2) 30(12,-2.4) 31(12,-1.6) 32(12,-0.8) 33(12,0)
  oval 0.4x2 smd: 12(2,-10) 13(2.8,-10) 14(3.6,-10) 15(4.4,-10) 16(5.2,-10) 17(6,-10) 18(6.8,-10) 19(7.6,-10) 20(8.4,-10) 21(9.2,-10) 22(10,-10) 34(10,2) 35(9.2,2) 36(8.4,2) 37(7.6,2) 38(6.8,2) 39(6,2) 40(5.2,2) 41(4.4,2) 42(3.6,2) 43(2.8,2) 44(2,2)
  round 0.8 smd: ""(0,-10) ""(12,2)
Top Overlay:
  circle w0.4: c0,1 r0.2
  lines w0.2: -2,-12 -2,4 14,4 14,-12 -2,-12 ; 1.508,-8.492 10.492,-8.492 10.492,0.492 3.016,0.492 1.508,-1.016 1.508,-8.492

## LQFP-144 [mm]
pads (146):
  rect 1.5x0.25 smd: 1(0,0)
  oval 1.5x0.25 smd: 2(0,-0.5) 3(0,-1) 4(0,-1.5) 5(0,-2) 6(0,-2.5) 7(0,-3) 8(0,-3.5) 9(0,-4) 10(0,-4.5) 11(0,-5) 12(0,-5.5) 13(0,-6) 14(0,-6.5) 15(0,-7) 16(0,-7.5) 17(0,-8) 18(0,-8.5) 19(0,-9) 20(0,-9.5) 21(0,-10) 22(0,-10.5) 23(0,-11) 24(0,-11.5) 25(0,-12) 26(0,-12.5) 27(0,-13) 28(0,-13.5) 29(0,-14) 30(0,-14.5) 31(0,-15) 32(0,-15.5) 33(0,-16) 34(0,-16.5) 35(0,-17) 36(0,-17.5) 73(21.5,-17.5) 74(21.5,-17) 75(21.5,-16.5) 76(21.5,-16) 77(21.5,-15.5) 78(21.5,-15) 79(21.5,-14.5) 80(21.5,-14) 81(21.5,-13.5) 82(21.5,-13) 83(21.5,-12.5) 84(21.5,-12) 85(21.5,-11.5) 86(21.5,-11) 87(21.5,-10.5) 88(21.5,-10) 89(21.5,-9.5) 90(21.5,-9) 91(21.5,-8.5) 92(21.5,-8) 93(21.5,-7.5) 94(21.5,-7) 95(21.5,-6.5) 96(21.5,-6) 97(21.5,-5.5) 98(21.5,-5) 99(21.5,-4.5) 100(21.5,-4) 101(21.5,-3.5) 102(21.5,-3) 103(21.5,-2.5) 104(21.5,-2) 105(21.5,-1.5) 106(21.5,-1) 107(21.5,-0.5) 108(21.5,0)
  oval 0.25x1.5 smd: 37(2,-19.5) 38(2.5,-19.5) 39(3,-19.5) 40(3.5,-19.5) 41(4,-19.5) 42(4.5,-19.5) 43(5,-19.5) 44(5.5,-19.5) 45(6,-19.5) 46(6.5,-19.5) 47(7,-19.5) 48(7.5,-19.5) 49(8,-19.5) 50(8.5,-19.5) 51(9,-19.5) 52(9.5,-19.5) 53(10,-19.5) 54(10.5,-19.5) 55(11,-19.5) 56(11.5,-19.5) 57(12,-19.5) 58(12.5,-19.5) 59(13,-19.5) 60(13.5,-19.5) 61(14,-19.5) 62(14.5,-19.5) 63(15,-19.5) 64(15.5,-19.5) 65(16,-19.5) 66(16.5,-19.5) 67(17,-19.5) 68(17.5,-19.5) 69(18,-19.5) 70(18.5,-19.5) 71(19,-19.5) 72(19.5,-19.5) 109(19.5,2) 110(19,2) 111(18.5,2) 112(18,2) 113(17.5,2) 114(17,2) 115(16.5,2) 116(16,2) 117(15.5,2) 118(15,2) 119(14.5,2) 120(14,2) 121(13.5,2) 122(13,2) 123(12.5,2) 124(12,2) 125(11.5,2) 126(11,2) 127(10.5,2) 128(10,2) 129(9.5,2) 130(9,2) 131(8.5,2) 132(8,2) 133(7.5,2) 134(7,2) 135(6.5,2) 136(6,2) 137(5.5,2) 138(5,2) 139(4.5,2) 140(4,2) 141(3.5,2) 142(3,2) 143(2.5,2) 144(2,2)
  round 0.8 smd: ""(0,-19.5) ""(21.5,2)
Top Overlay:
  circle w0.4: c0,1 r0.2
  lines w0.2: -2,-21.5 -2,4 23.5,4 23.5,-21.5 -2,-21.5 ; 1.285,-18.215 1.285,-0.57 2.57,0.715 20.215,0.715 20.215,-18.215 1.285,-18.215

## LQFP-144-L [mm]
height 1.016
pads (146):
  round 1.016 smd: 0(-0.635,1.905) 0(22.225,-19.685)
  oval 1.5x0.25 smd: 1(0,0) 2(0,-0.5) 3(0,-1) 4(0,-1.5) 5(0,-2) 6(0,-2.5) 7(0,-3) 8(0,-3.5) 9(0,-4) 10(0,-4.5) 11(0,-5) 12(0,-5.5) 13(0,-6) 14(0,-6.5) 15(0,-7) 16(0,-7.5) 17(0,-8) 18(0,-8.5) 19(0,-9) 20(0,-9.5) 21(0,-10) 22(0,-10.5) 23(0,-11) 24(0,-11.5) 25(0,-12) 26(0,-12.5) 27(0,-13) 28(0,-13.5) 29(0,-14) 30(0,-14.5) 31(0,-15) 32(0,-15.5) 33(0,-16) 34(0,-16.5) 35(0,-17) 36(0,-17.5) 73(21.5,-17.5) 74(21.5,-17) 75(21.5,-16.5) 76(21.5,-16) 77(21.5,-15.5) 78(21.5,-15) 79(21.5,-14.5) 80(21.5,-14) 81(21.5,-13.5) 82(21.5,-13) 83(21.5,-12.5) 84(21.5,-12) 85(21.5,-11.5) 86(21.5,-11) 87(21.5,-10.5) 88(21.5,-10) 89(21.5,-9.5) 90(21.5,-9) 91(21.5,-8.5) 92(21.5,-8) 93(21.5,-7.5) 94(21.5,-7) 95(21.5,-6.5) 96(21.5,-6) 97(21.5,-5.5) 98(21.5,-5) 99(21.5,-4.5) 100(21.5,-4) 101(21.5,-3.5) 102(21.5,-3) 103(21.5,-2.5) 104(21.5,-2) 105(21.5,-1.5) 106(21.5,-1) 107(21.5,-0.5) 108(21.5,0)
  oval 0.25x1.5 smd: 37(2,-19.5) 38(2.5,-19.5) 39(3,-19.5) 40(3.5,-19.5) 41(4,-19.5) 42(4.5,-19.5) 43(5,-19.5) 44(5.5,-19.5) 45(6,-19.5) 46(6.5,-19.5) 47(7,-19.5) 48(7.5,-19.5) 49(8,-19.5) 50(8.5,-19.5) 51(9,-19.5) 52(9.5,-19.5) 53(10,-19.5) 54(10.5,-19.5) 55(11,-19.5) 56(11.5,-19.5) 57(12,-19.5) 58(12.5,-19.5) 59(13,-19.5) 60(13.5,-19.5) 61(14,-19.5) 62(14.5,-19.5) 63(15,-19.5) 64(15.5,-19.5) 65(16,-19.5) 66(16.5,-19.5) 67(17,-19.5) 68(17.5,-19.5) 69(18,-19.5) 70(18.5,-19.5) 71(19,-19.5) 72(19.5,-19.5) 109(19.5,2) 110(19,2) 111(18.5,2) 112(18,2) 113(17.5,2) 114(17,2) 115(16.5,2) 116(16,2) 117(15.5,2) 118(15,2) 119(14.5,2) 120(14,2) 121(13.5,2) 122(13,2) 123(12.5,2) 124(12,2) 125(11.5,2) 126(11,2) 127(10.5,2) 128(10,2) 129(9.5,2) 130(9,2) 131(8.5,2) 132(8,2) 133(7.5,2) 134(7,2) 135(6.5,2) 136(6,2) 137(5.5,2) 138(5,2) 139(4.5,2) 140(4,2) 141(3.5,2) 142(3,2) 143(2.5,2) 144(2,2)
Top Overlay:
  lines w0.2: 1.285,-18.215 20.215,-18.215 20.215,0.715 2.57,0.715 1.285,-0.57 1.285,-18.215

## LQFP-160-24 [mil]
pads (160):
  rect 60x10 smd: 1(0,0)
  oval 60x10 smd: 2(0,-19.68) 3(0,-39.37) 4(0,-59.05) 5(0,-78.74) 6(0,-98.42) 7(0,-118.11) 8(0,-137.79) 9(0,-157.48) 10(0,-177.16) 11(0,-196.85) 12(0,-216.53) 13(0,-236.22) 14(0,-255.91) 15(0,-275.59) 16(0,-295.27) 17(0,-314.96) 18(0,-334.64) 19(0,-354.33) 20(0,-374.01) 21(0,-393.7) 22(0,-413.38) 23(0,-433.07) 24(0,-452.75) 25(0,-472.44) 26(0,-492.12) 27(0,-511.81) 28(0,-531.5) 29(0,-551.18) 30(0,-570.87) 31(0,-590.55) 32(0,-610.24) 33(0,-629.92) 34(0,-649.61) 35(0,-669.29) 36(0,-688.98) 37(0,-708.66) 38(0,-728.35) 39(0,-748.03) 40(0,-767.72) 81(1023.62,-767.72) 82(1023.62,-748.03) 83(1023.62,-728.35) 84(1023.62,-708.66) 85(1023.62,-688.98) 86(1023.62,-669.29) 87(1023.62,-649.61) 88(1023.62,-629.92) 89(1023.62,-610.24) 90(1023.62,-590.55) 91(1023.62,-570.87) 92(1023.62,-551.18) 93(1023.62,-531.5) 94(1023.62,-511.81) 95(1023.62,-492.12) 96(1023.62,-472.44) 97(1023.62,-452.75) 98(1023.62,-433.07) 99(1023.62,-413.38) 100(1023.62,-393.7) 101(1023.62,-374.01) 102(1023.62,-354.33) 103(1023.62,-334.64) 104(1023.62,-314.96) 105(1023.62,-295.27) 106(1023.62,-275.59) 107(1023.62,-255.91) 108(1023.62,-236.22) 109(1023.62,-216.53) 110(1023.62,-196.85) 111(1023.62,-177.16) 112(1023.62,-157.48) 113(1023.62,-137.79) 114(1023.62,-118.11) 115(1023.62,-98.42) 116(1023.62,-78.74) 117(1023.62,-59.05) 118(1023.62,-39.37) 119(1023.62,-19.68) 120(1023.62,0)
  oval 10x60 smd: 41(127.95,-895.67) 42(147.64,-895.67) 43(167.32,-895.67) 44(187.01,-895.67) 45(206.69,-895.67) 46(226.38,-895.67) 47(246.06,-895.67) 48(265.75,-895.67) 49(285.43,-895.67) 50(305.12,-895.67) 51(324.8,-895.67) 52(344.49,-895.67) 53(364.17,-895.67) 54(383.86,-895.67) 55(403.54,-895.67) 56(423.23,-895.67) 57(442.91,-895.67) 58(462.6,-895.67) 59(482.28,-895.67) 60(501.97,-895.67) 61(521.65,-895.67) 62(541.34,-895.67) 63(561.02,-895.67) 64(580.71,-895.67) 65(600.39,-895.67) 66(620.08,-895.67) 67(639.76,-895.67) 68(659.45,-895.67) 69(679.13,-895.67) 70(698.82,-895.67) 71(718.5,-895.67) 72(738.19,-895.67) 73(757.87,-895.67) 74(777.56,-895.67) 75(797.24,-895.67) 76(816.93,-895.67) 77(836.61,-895.67) 78(856.3,-895.67) 79(875.98,-895.67) 80(895.67,-895.67) 121(895.67,127.95) 122(875.98,127.95) 123(856.3,127.95) 124(836.61,127.95) 125(816.93,127.95) 126(797.24,127.95) 127(777.56,127.95) 128(757.87,127.95) 129(738.19,127.95) 130(718.5,127.95) 131(698.82,127.95) 132(679.13,127.95) 133(659.45,127.95) 134(639.76,127.95) 135(620.08,127.95) 136(600.39,127.95) 137(580.71,127.95) 138(561.02,127.95) 139(541.34,127.95) 140(521.65,127.95) 141(501.97,127.95) 142(482.28,127.95) 143(462.6,127.95) 144(442.91,127.95) 145(423.23,127.95) 146(403.54,127.95) 147(383.86,127.95) 148(364.17,127.95) 149(344.49,127.95) 150(324.8,127.95) 151(305.12,127.95) 152(285.43,127.95) 153(265.75,127.95) 154(246.06,127.95) 155(226.38,127.95) 156(206.69,127.95) 157(187.01,127.95) 158(167.32,127.95) 159(147.64,127.95) 160(127.95,127.95)
Top Overlay:
  circle w20: c118.03,15 r26.97
  lines w7.87: 50.59,-845.08 973.03,-845.08 973.03,77.36 101.18,77.36 50.59,26.77 50.59,-845.08

## M_433M [mm]
pads (12):
  rect 2x0.9 smd: 1(-0.508,14.97) 2(-0.508,13.7) 3(-0.508,12.43) 4(-0.508,11.16) 5(-0.508,9.89) 6(-0.508,8.62) 7(-0.508,7.35) 8(-0.508,6.08) 9(-0.508,4.81) 10(-0.508,3.54) 11(-0.508,2.27) 12(-0.508,1)
Top Overlay:
  lines w0.254: 16,14.605 43,14.605 ; 0,0 0,16.002 16,16.002 16,0 0,0

## M_12864 [mm]
pads (38):
  rect 0.25x3 smd: 1(38.75,-16.698) 2(38.25,-16.698) 3(37.75,-16.698) 4(37.25,-16.698) 5(36.75,-16.698) 6(36.25,-16.698) 7(35.75,-16.698) 8(35.25,-16.698) 9(34.75,-16.698) 10(34.25,-16.698) 11(33.75,-16.698) 12(33.25,-16.698) 13(32.75,-16.698) 14(32.25,-16.698) 15(31.75,-16.698) 16(31.25,-16.698) 17(30.75,-16.698) 18(30.25,-16.698) 19(29.75,-16.698) 20(29.25,-16.698) 21(28.75,-16.698) 22(28.25,-16.698) 23(27.75,-16.698) 24(27.25,-16.698) 25(26.75,-16.698) 26(26.25,-16.698) 27(25.75,-16.698) 28(25.25,-16.698) 29(24.75,-16.698) 30(24.25,-16.698) 31(23.75,-16.698) 32(23.25,-16.698) 33(22.75,-16.698) 34(22.25,-16.698) 35(21.75,-16.698) 36(21.25,-16.698)
  rect 1.8x1.5 hole 0.8 slot 1.62 at 0 deg: 37(47.32,1.1) 38(12.69,1.1)
via 58.5,43.5 diameter 3 hole 2.3
via 1.5,43.5 diameter 3 hole 2.3
Top Overlay:
  lines w0.1: 14.681,0 14.7,-0.019 ; 20.75,-15.113 39.243,-15.113 39.243,-18.313 20.752,-18.313 20.75,-15.113
  lines w0.154: 0,0 0,45 60,45 60,0 0,0

## M_Antenna_Ext1 [mm]
pads (4):
  rect 3x1.2 smd: 1(-1.295,0.229)
  rect 4x1.6 all layers, no hole: 2(-1.495,-2.271) 3(-1.495,2.729)
  rect 1.6x4 smd far side: 3(-0.295,0.229)
Top Overlay:
  lines w0.051: 0.505,-2.771 8.505,-2.771 8.505,3.229 0.505,3.229 1.005,3.229 ; 5.705,-2.771 5.705,3.229 ; 6.005,-2.771 6.005,3.229 ; 6.305,-2.771 6.305,3.229 ; 6.605,-2.671 6.605,3.229 ; 6.905,-2.771 6.905,3.229 ; 7.205,-2.671 7.205,3.229 ; 7.505,-2.771 7.505,3.229 ; 7.805,-2.771 7.805,3.229 ; 0.505,-3.071 1.305,-3.071 1.305,3.529 0.505,3.529 0.505,-3.071